# Altium footprint library Connectors.PcbLib: 408 footprints (part 5 of 26)
Each footprint in its own frame and in the unit in brackets; x right, y up, seen from the top. Pads: shape width x height; smd on the part's side, far side on the other; paste and mask are expansions set on the pad; w line width, h text height; cw(c..) or ccw(c..) is an arc to the next point about the centre after c.
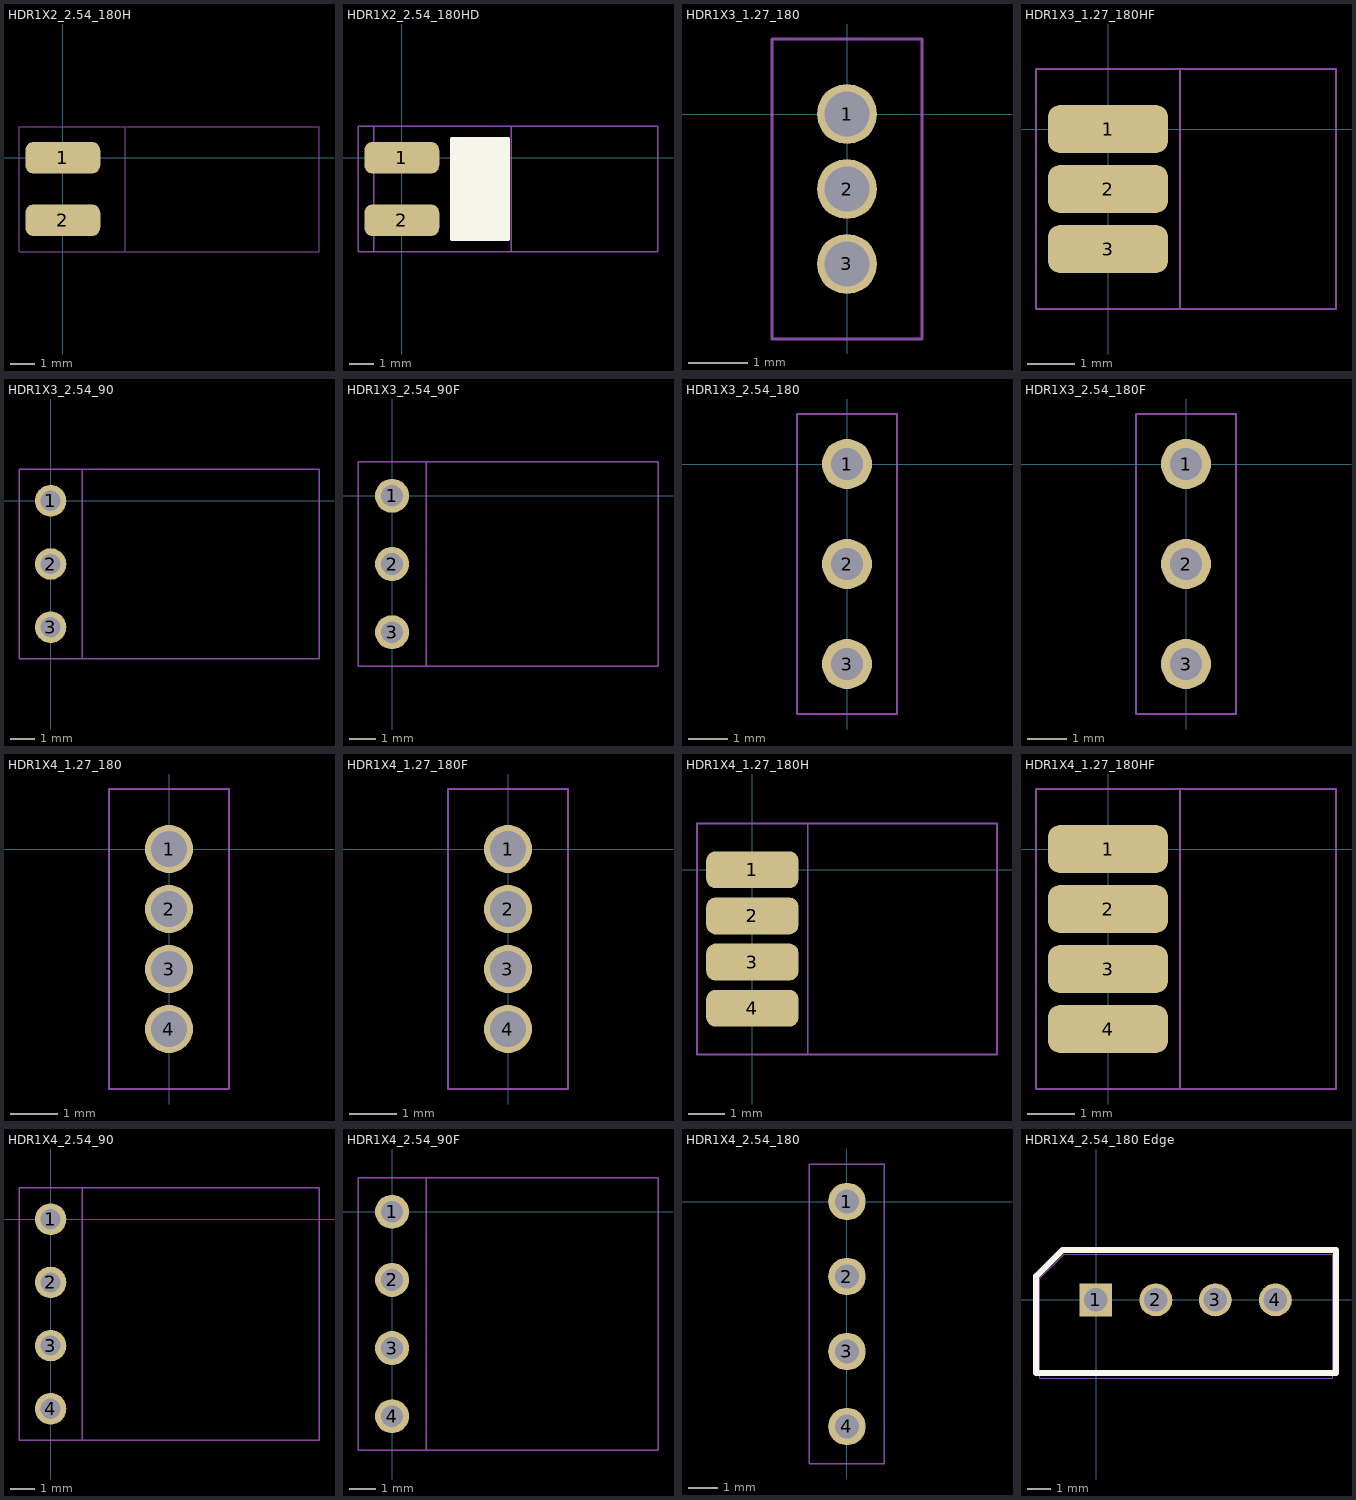
[diagram p4: the footprints below, top view; thin cyan lines are the x and y axes]

## HDR1X2_2.54_180H [mil]
height 169.29
pads (2):
  rrect50% 120x50 smd: 1(0,0) 2(0,-100)
Mechanical 13:
  lines w2: -70,-150 -70,50 410,50 410,-150 -70,-150
Mechanical 14:
  lines w2: -70,-150 100,-150 100,50 -70,50 -70,-150
  text ".Designator" at -31,-70 h80
3D body "pin_header_aw140-eg-g02d.stp": height 61.32, standoff -37.05, extent -35,-150 405.94,50

## HDR1X2_2.54_180HD [mil]
height 169.29
pads (2):
  rrect50% 120x50 smd: 1(0,0) 2(0,-100)
Top Overlay:
  region: 80,30 170,30 170,-130 80,-130
  lines w6: 80,-130 170,-130 170,30 80,30 80,-130
Mechanical 13:
  lines w2: -45,-150 409.65,-150 409.65,50 -45,50 -45,-150
Mechanical 14:
  lines w2: -70,-150 -70,50 175,50 175,-150 -70,-150
  text ".Designator" at -31,-70 h80
3D body "pin_header_aw140-eg-g02d.stp": height 101.32, standoff 2.95, extent -45.47,-150 395.47,50

## HDR1X3_1.27_180 [mil]
height 169.29
pads (3):
  round 40 hole 30: 1(0,0) 2(0,-50) 3(0,-100)
Mechanical 13:
  lines w2: -50,-150 50,-150 50,50 -50,50 -50,-150
Mechanical 14:
  lines w2: -50,-150 50,-150 50,50 -50,50 -50,-150
  text ".Designator" at -31,-70 h80

## HDR1X3_1.27_180HF [mil]
height 169.29
pads (3):
  rrect50% 100x40 smd: 1(0,0) 2(0,-50) 3(0,-100)
Mechanical 13:
  lines w2: -60,-150 190,-150 190,50 -60,50 -60,-150
Mechanical 14:
  lines w2: -60,-150 -60,50 60,50 60,-150 -60,-150
  text ".Designator" at -31,-70 h80
3D body "female_header_a-bl127-eg-g03d.stp": height 35.43, standoff -35.43, extent -38.35,-132.87 190,32.88

## HDR1X3_2.54_90 [mil]
height 169.29
pads (3):
  round 50 hole 32: 1(0,0) 2(0,-100) 3(0,-200)
Mechanical 13:
  lines w2: -50,-250 -50,50 425,50 425,-250 -50,-250
Mechanical 14:
  lines w2: -50,-250 50,-250 50,50 -50,50 -50,-250
  text ".Designator" at -31,-120 h80
3D body "pin_header_aw140-ea-g03g.stp": height 99.21, standoff -93.7, extent -15,-246.06 423.58,46.06

## HDR1X3_2.54_90F [mil]
height 169.29
pads (3):
  round 50 hole 32: 1(0,0) 2(0,-100) 3(0,-200)
Mechanical 13:
  lines w2: -50,-250 -50,50 390,50 390,-250 -50,-250
Mechanical 14:
  lines w2: -50,-250 50,-250 50,50 -50,50 -50,-250
  text ".Designator" at -31,-120 h80
3D body "female_header_a-bl254-ea-g03d.stp": height 99.21, standoff -125.2, extent -10,-254.92 386.06,54.92

## HDR1X3_2.54_180 [mil]
height 169.29
pads (3):
  round 50 hole 32: 1(0,0) 2(0,-100) 3(0,-200)
Mechanical 13:
  lines w2: -50,-250 50,-250 50,50 -50,50 -50,-250
Mechanical 14:
  lines w2: -50,-250 50,-250 50,50 -50,50 -50,-250
  text ".Designator" at -31,-120 h80
3D body "pin_header_aw140-eg-g03d.stp": height 322.83, standoff -118.11, extent -49.18,-250 49.18,50

## HDR1X3_2.54_180F [mil]
height 169.29
pads (3):
  round 50 hole 32: 1(0,0) 2(0,-100) 3(0,-200)
Mechanical 13:
  lines w2: -50,-250 -50,50 50,50 50,-250 -50,-250
Mechanical 14:
  lines w2: -50,-250 -50,50 50,50 50,-250 -50,-250
  text ".Designator" at -31,-120 h80
3D body "female_header_a-bl254-eg-g03d.stp": height 334.65, standoff -125.98, extent -49.21,-254.91 49.22,54.92

## HDR1X4_1.27_180 [mil]
height 169.29
pads (4):
  round 40 hole 30: 1(0,0) 2(0,-50) 3(0,-100) 4(0,-150)
Mechanical 13:
  lines w2: -50,-200 -50,50 50,50 50,-200 -50,-200
Mechanical 14:
  lines w2: -50,-200 -50,50 50,50 50,-200 -50,-200
  text ".Designator" at -31,-95 h80
3D body "pin_header_a-sl127-eg-g04d.stp": height 210.24, standoff -102.36, extent -49.21,-174.99 49.21,25.01

## HDR1X4_1.27_180F [mil]
height 169.29
pads (4):
  round 40 hole 30: 1(0,0) 2(0,-50) 3(0,-100) 4(0,-150)
Mechanical 13:
  lines w2: -50,-200 50,-200 50,50 -50,50 -50,-200
Mechanical 14:
  lines w2: -50,-200 50,-200 50,50 -50,50 -50,-200
  text ".Designator" at -31,-95 h80
3D body "female_header_a-bl127-eg-g04d.stp": height 133.86, standoff -94.49, extent -35.87,-182.88 35,32.88

## HDR1X4_1.27_180H [mil]
height 169.29
pads (4):
  rrect50% 100x40 smd: 1(0,0) 2(0,-50) 3(0,-100) 4(0,-150)
Mechanical 13:
  lines w2: -60,-200 -60,50 265,50 265,-200 -60,-200
Mechanical 14:
  lines w2: -60,-200 -60,50 60,50 60,-200 -60,-200
  text ".Designator" at -31,-95 h80
3D body "pin_header_a-sl127-eg-g04d.stp": height 59.21, standoff -39.21, extent -47.36,-174.99 265.24,25.01

## HDR1X4_1.27_180HF [mil]
height 169.29
pads (4):
  rrect50% 100x40 smd: 1(0,0) 2(0,-50) 3(0,-100) 4(0,-150)
Mechanical 13:
  lines w2: -60,-200 -60,50 190,50 190,-200 -60,-200
Mechanical 14:
  lines w2: -60,-200 60,-200 60,50 -60,50 -60,-200
  text ".Designator" at -31,-95 h80
3D body "female_header_a-bl127-eg-g04d.stp": height 45.43, standoff -25.43, extent -38.35,-182.88 190,32.88

## HDR1X4_2.54_90 [mil]
height 169.29
pads (4):
  round 50 hole 32: 1(0,0) 2(0,-100) 3(0,-200) 4(0,-300)
Mechanical 13:
  lines w2: -50,-350 425,-350 425,50 -50,50 -50,-350
Mechanical 14:
  lines w2: -50,-350 -50,50 50,50 50,-350 -50,-350
  text ".Designator" at -31,-170 h80
3D body "pin_header_aw140-ea-g04g.stp": height 99.21, standoff -93.7, extent -14.96,-346.06 423.62,46.07

## HDR1X4_2.54_90F [mil]
height 169.29
pads (4):
  round 50 hole 32: 1(0,0) 2(0,-100) 3(0,-200) 4(0,-300)
Mechanical 13:
  lines w2: -50,-350 -50,50 390,50 390,-350 -50,-350
Mechanical 14:
  lines w2: -50,-350 50,-350 50,50 -50,50 -50,-350
  text ".Designator" at -31,-170 h80
3D body "female_header_a-bl254-ea-g04d.stp": height 99.21, standoff -125.2, extent -10,-354.92 386.06,54.92

## HDR1X4_2.54_180 [mil]
height 169.29
pads (4):
  round 50 hole 32: 1(0,0) 2(0,-100) 3(0,-200) 4(0,-300)
Mechanical 13:
  lines w2: -50,-350 -50,50 50,50 50,-350 -50,-350
Mechanical 14:
  lines w2: -50,-350 -50,50 50,50 50,-350 -50,-350
  text ".Designator" at -31,-170 h80
3D body "pin_header_aw140-eg-g04d.stp": height 322.83, standoff -118.11, extent -49.18,-350 49.18,50

## HDR1X4_2.54_180 Edge [mm]
height 4.3
pads (4):
  rect 1.4x1.4 hole 1: 1(-0.014,0.001)
  round 1.4 hole 1: 2(2.54,0) 3(5.066,0.001) 4(7.62,0)
Top Overlay:
  lines w0.254: -2.541,1.006 -1.422,2.125 -1.401,2.125 10.196,2.125 ; -2.554,-3.103 -2.554,1.014 -1.428,2.119 10.196,2.119 10.196,-3.103 -2.554,-3.103
Mechanical 13:
  lines w0.051: -2.385,-3.323 -2.385,0.92 -1.355,1.95 10.058,1.95 10.058,-3.323 -2.385,-3.323
3D body "JST B4B-XH-A.STEP": height 7, standoff -3.4, extent -2.39,-3.194 10.01,2.556